# Altium schematic symbol library MCU_ST_STM32H7.SchLib: 191 symbols (part 3 of 8) (continued)
## STM32H725IETx (continued)
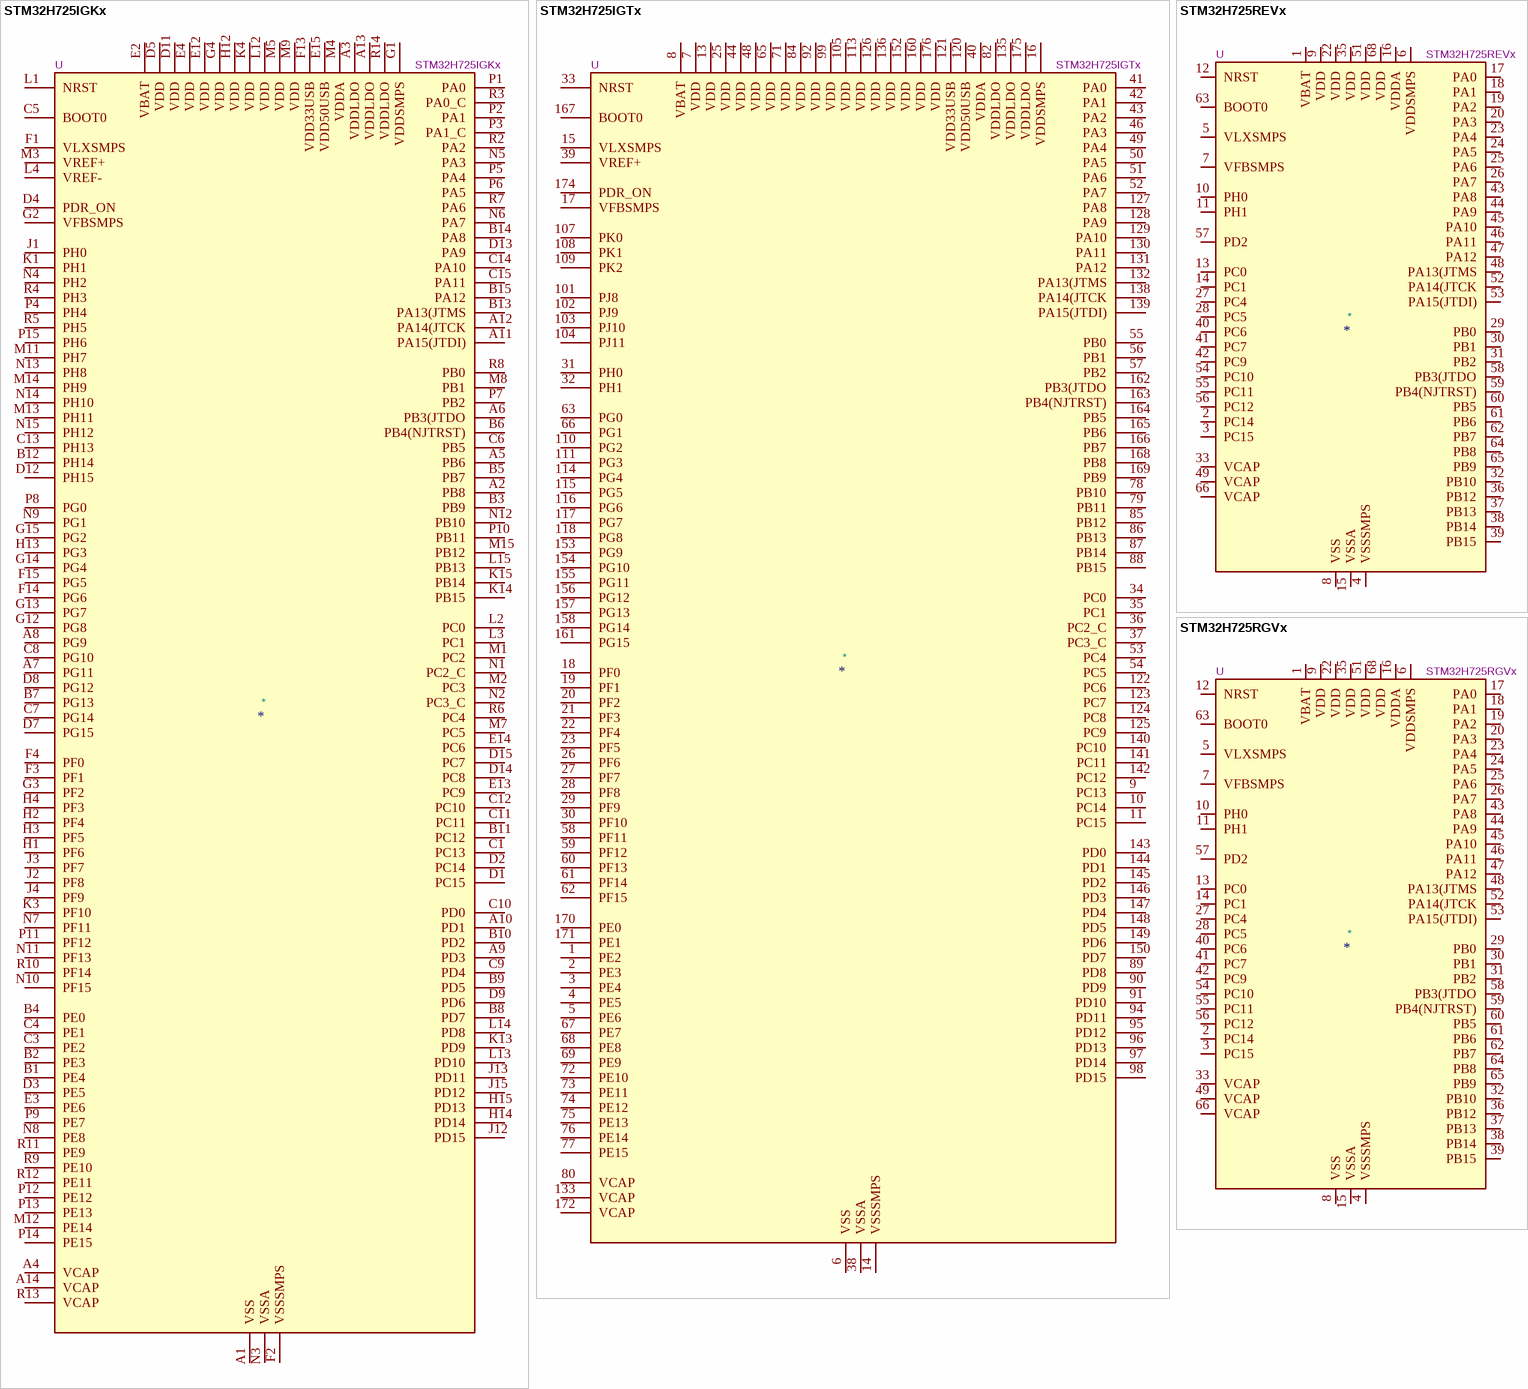
[diagram p24: symbols STM32H725IGKx to STM32H725RGVx]

## STM32H725IGKx
designator *  value STM32H725IGKx  Reference: U
ki_keywords: Arm Cortex-M7 STM32H7 STM32H725/735; ki_description: STMicroelectronics Arm Cortex-M7 MCU, 1024KB flash, 564KB RAM, 550 MHz, 1.62-3.6V, 132 GPIO, UFBGA176; ki_fp_filters: *UFBGA*10x10mm*Layout15x15*P0.65mm*; Footprint: Package_BGA:UFBGA-201_10x10mm_Layout15x15_P0.65mm; Datasheet: https://www.st.com/resource/en/datasheet/stm32h725ig.pdf
pins: A1 VSS, A2 PB8, A3 VDDLDO, A4 VCAP, A5 PB6, A6 PB3(JTDO, A7 PG11, A8 PG9, A9 PD3, A10 PD1, A11 PA15(JTDI), A12 PA14(JTCK, A13 VDDLDO, A14 VCAP, A15 VSS hidden, B1 PE4, B2 PE3, B3 PB9, B4 PE0, B5 PB7, B6 PB4(NJTRST), B7 PG13, B8 PD7, B9 PD5, B10 PD2, B11 PC12, B12 PH14, B13 PA13(JTMS, B14 PA8, B15 PA12, C1 PC13, C2 VSS hidden, C3 PE2, C4 PE1, C5 BOOT0, C6 PB5, C7 PG14, C8 PG10, C9 PD4, C10 PD0, C11 PC11, C12 PC10, C13 PH13, C14 PA10, C15 PA11, D1 PC15, D2 PC14, D3 PE5, D4 PDR_ON, D5 VDD, D6 VSS hidden, D7 PG15, D8 PG12, D9 PD6, D10 VSS hidden, D11 VDD, D12 PH15, D13 PA9, D14 PC8, D15 PC7, E1 VSS hidden, E2 VBAT, E3 PE6, E4 VDD, E12 VDD, E13 PC9, E14 PC6, E15 VDD50USB, F1 VLXSMPS, F2 VSSSMPS, F3 PF1, F4 PF0, F6 VSS hidden, F7 VSS hidden, F8 VSS hidden, F9 VSS hidden, F10 VSS hidden, F12 VSS hidden, F13 VDD33USB, F14 PG6, F15 PG5, G1 VDDSMPS, G2 VFBSMPS, G3 PF2, G4 VDD, G6 VSS hidden, G7 VSS hidden, G8 VSS hidden, G9 VSS hidden, G10 VSS hidden, G12 PG8, G13 PG7, G14 PG4, G15 PG2, H1 PF6, H2 PF4, H3 PF5, H4 PF3, H6 VSS hidden, H7 VSS hidden, H8 VSS hidden, H9 VSS hidden, H10 VSS hidden, H12 VDD, H13 PG3, H14 PD14, H15 PD13, J1 PH0, J2 PF8, J3 PF7, J4 PF9, J6 VSS hidden, J7 VSS hidden, J8 VSS hidden, J9 VSS hidden, J10 VSS hidden, J12 PD15, J13 PD11, J14 VSS hidden, J15 PD12, K1 PH1, K2 VSS hidden, K3 PF10, K4 VDD, K6 VSS hidden, K7 VSS hidden, K8 VSS hidden, K9 VSS hidden, K10 VSS hidden, K12 VSS hidden, K13 PD9, K14 PB15, K15 PB14, L1 NRST, L2 PC0, L3 PC1, L4 VREF-, L12 VDD, L13 PD10, L14 PD8, L15 PB13, M1 PC2, M2 PC3, M3 VREF+, M4 VDDA, M5 VDD, M6 VSS hidden, M7 PC5, M8 PB1, M9 VDD, M10 VSS hidden, M11 PH7, M12 PE14, M13 PH11, M14 PH9, M15 PB12, N1 PC2_C, N2 PC3_C, N3 VSSA, N4 PH2, N5 PA3, N6 PA7, N7 PF11, N8 PE8, N9 PG1, N10 PF15, N11 PF13, N12 PB10, N13 PH8, N14 PH10, N15 PH12, P1 PA0, P2 PA1, P3 PA1_C, P4 PH4, P5 PA4, P6 PA5, P7 PB2, P8 PG0, P9 PE7, P10 PB11, P11 PF12, P12 PE12, P13 PE13, P14 PE15, P15 PH6, R1 VSS hidden, R2 PA2, R3 PA0_C, R4 PH3, R5 PH5, R6 PC4, R7 PA6, R8 PB0, R9 PE10, R10 PF14, R11 PE9, R12 PE11, R13 VCAP, R14 VDDLDO, R15 VSS hidden

## STM32H725IGTx
designator *  value STM32H725IGTx  Reference: U
ki_keywords: Arm Cortex-M7 STM32H7 STM32H725/735; ki_description: STMicroelectronics Arm Cortex-M7 MCU, 1024KB flash, 564KB RAM, 550 MHz, 1.62-3.6V, 121 GPIO, LQFP176; ki_fp_filters: LQFP*24x24mm*P0.5mm*; Footprint: Package_QFP:LQFP-176_24x24mm_P0.5mm; Datasheet: https://www.st.com/resource/en/datasheet/stm32h725ig.pdf
pins: 1 PE2, 2 PE3, 3 PE4, 4 PE5, 5 PE6, 6 VSS, 7 VDD, 8 VBAT, 9 PC13, 10 PC14, 11 PC15, 12 VSS hidden, 13 VDD, 14 VSSSMPS, 15 VLXSMPS, 16 VDDSMPS, 17 VFBSMPS, 18 PF0, 19 PF1, 20 PF2, 21 PF3, 22 PF4, 23 PF5, 24 VSS hidden, 25 VDD, 26 PF6, 27 PF7, 28 PF8, 29 PF9, 30 PF10, 31 PH0, 32 PH1, 33 NRST, 34 PC0, 35 PC1, 36 PC2_C, 37 PC3_C, 38 VSSA, 39 VREF+, 40 VDDA, 41 PA0, 42 PA1, 43 PA2, 44 VDD, 45 VSS hidden, 46 PA3, 47 VSS hidden, 48 VDD, 49 PA4, 50 PA5, 51 PA6, 52 PA7, 53 PC4, 54 PC5, 55 PB0, 56 PB1, 57 PB2, 58 PF11, 59 PF12, 60 PF13, 61 PF14, 62 PF15, 63 PG0, 64 VSS hidden, 65 VDD, 66 PG1, 67 PE7, 68 PE8, 69 PE9, 70 VSS hidden, 71 VDD, 72 PE10, 73 PE11, 74 PE12, 75 PE13, 76 PE14, 77 PE15, 78 PB10, 79 PB11, 80 VCAP, 81 VSS hidden, 82 VDDLDO, 83 VSS hidden, 84 VDD, 85 PB12, 86 PB13, 87 PB14, 88 PB15, 89 PD8, 90 PD9, 91 PD10, 92 VDD, 93 VSS hidden, 94 PD11, 95 PD12, 96 PD13, 97 PD14, 98 PD15, 99 VDD, 100 VSS hidden, 101 PJ8, 102 PJ9, 103 PJ10, 104 PJ11, 105 VDD, 106 VSS hidden, 107 PK0, 108 PK1, 109 PK2, 110 PG2, 111 PG3, 112 VSS hidden, 113 VDD, 114 PG4, 115 PG5, 116 PG6, 117 PG7, 118 PG8, 119 VSS hidden, 120 VDD50USB, 121 VDD33USB, 122 PC6, 123 PC7, 124 PC8, 125 PC9, 126 VDD, 127 PA8, 128 PA9, 129 PA10, 130 PA11, 131 PA12, 132 PA13(JTMS, 133 VCAP, 134 VSS hidden, 135 VDDLDO, 136 VDD, 137 VSS hidden, 138 PA14(JTCK, 139 PA15(JTDI), 140 PC10, 141 PC11, 142 PC12, 143 PD0, 144 PD1, 145 PD2, 146 PD3, 147 PD4, 148 PD5, 149 PD6, 150 PD7, 151 VSS hidden, 152 VDD, 153 PG9, 154 PG10, 155 PG11, 156 PG12, 157 PG13, 158 PG14, 159 VSS hidden, 160 VDD, 161 PG15, 162 PB3(JTDO, 163 PB4(NJTRST), 164 PB5, 165 PB6, 166 PB7, 167 BOOT0, 168 PB8, 169 PB9, 170 PE0, 171 PE1, 172 VCAP, 173 VSS hidden, 174 PDR_ON, 175 VDDLDO, 176 VDD

## STM32H725REVx
designator *  value STM32H725REVx  Reference: U
ki_keywords: Arm Cortex-M7 STM32H7 STM32H725/735; ki_description: STMicroelectronics Arm Cortex-M7 MCU, 512KB flash, 564KB RAM, 550 MHz, 1.71-3.6V, 46 GPIO, VFQFPN68; ki_fp_filters: QFN*1EP*8x8mm*P0.4mm*; Footprint: Package_DFN_QFN:QFN-68-1EP_8x8mm_P0.4mm_EP6.4x6.4mm; Datasheet: https://www.st.com/resource/en/datasheet/stm32h725re.pdf
pins: 1 VBAT, 2 PC14, 3 PC15, 4 VSSSMPS, 5 VLXSMPS, 6 VDDSMPS, 7 VFBSMPS, 8 VSS, 9 VDD, 10 PH0, 11 PH1, 12 NRST, 13 PC0, 14 PC1, 15 VSSA, 16 VDDA, 17 PA0, 18 PA1, 19 PA2, 20 PA3, 21 VSS hidden, 22 VDD, 23 PA4, 24 PA5, 25 PA6, 26 PA7, 27 PC4, 28 PC5, 29 PB0, 30 PB1, 31 PB2, 32 PB10, 33 VCAP, 34 VSS hidden, 35 VDD, 36 PB12, 37 PB13, 38 PB14, 39 PB15, 40 PC6, 41 PC7, 42 PC9, 43 PA8, 44 PA9, 45 PA10, 46 PA11, 47 PA12, 48 PA13(JTMS, 49 VCAP, 50 VSS hidden, 51 VDD, 52 PA14(JTCK, 53 PA15(JTDI), 54 PC10, 55 PC11, 56 PC12, 57 PD2, 58 PB3(JTDO, 59 PB4(NJTRST), 60 PB5, 61 PB6, 62 PB7, 63 BOOT0, 64 PB8, 65 PB9, 66 VCAP, 67 VSS hidden, 68 VDD, 69 VSS hidden

## STM32H725RGVx
designator *  value STM32H725RGVx  Reference: U
ki_keywords: Arm Cortex-M7 STM32H7 STM32H725/735; ki_description: STMicroelectronics Arm Cortex-M7 MCU, 1024KB flash, 564KB RAM, 550 MHz, 1.71-3.6V, 46 GPIO, VFQFPN68; ki_fp_filters: QFN*1EP*8x8mm*P0.4mm*; Footprint: Package_DFN_QFN:QFN-68-1EP_8x8mm_P0.4mm_EP6.4x6.4mm; Datasheet: https://www.st.com/resource/en/datasheet/stm32h725rg.pdf
pins: 1 VBAT, 2 PC14, 3 PC15, 4 VSSSMPS, 5 VLXSMPS, 6 VDDSMPS, 7 VFBSMPS, 8 VSS, 9 VDD, 10 PH0, 11 PH1, 12 NRST, 13 PC0, 14 PC1, 15 VSSA, 16 VDDA, 17 PA0, 18 PA1, 19 PA2, 20 PA3, 21 VSS hidden, 22 VDD, 23 PA4, 24 PA5, 25 PA6, 26 PA7, 27 PC4, 28 PC5, 29 PB0, 30 PB1, 31 PB2, 32 PB10, 33 VCAP, 34 VSS hidden, 35 VDD, 36 PB12, 37 PB13, 38 PB14, 39 PB15, 40 PC6, 41 PC7, 42 PC9, 43 PA8, 44 PA9, 45 PA10, 46 PA11, 47 PA12, 48 PA13(JTMS, 49 VCAP, 50 VSS hidden, 51 VDD, 52 PA14(JTCK, 53 PA15(JTDI), 54 PC10, 55 PC11, 56 PC12, 57 PD2, 58 PB3(JTDO, 59 PB4(NJTRST), 60 PB5, 61 PB6, 62 PB7, 63 BOOT0, 64 PB8, 65 PB9, 66 VCAP, 67 VSS hidden, 68 VDD, 69 VSS hidden

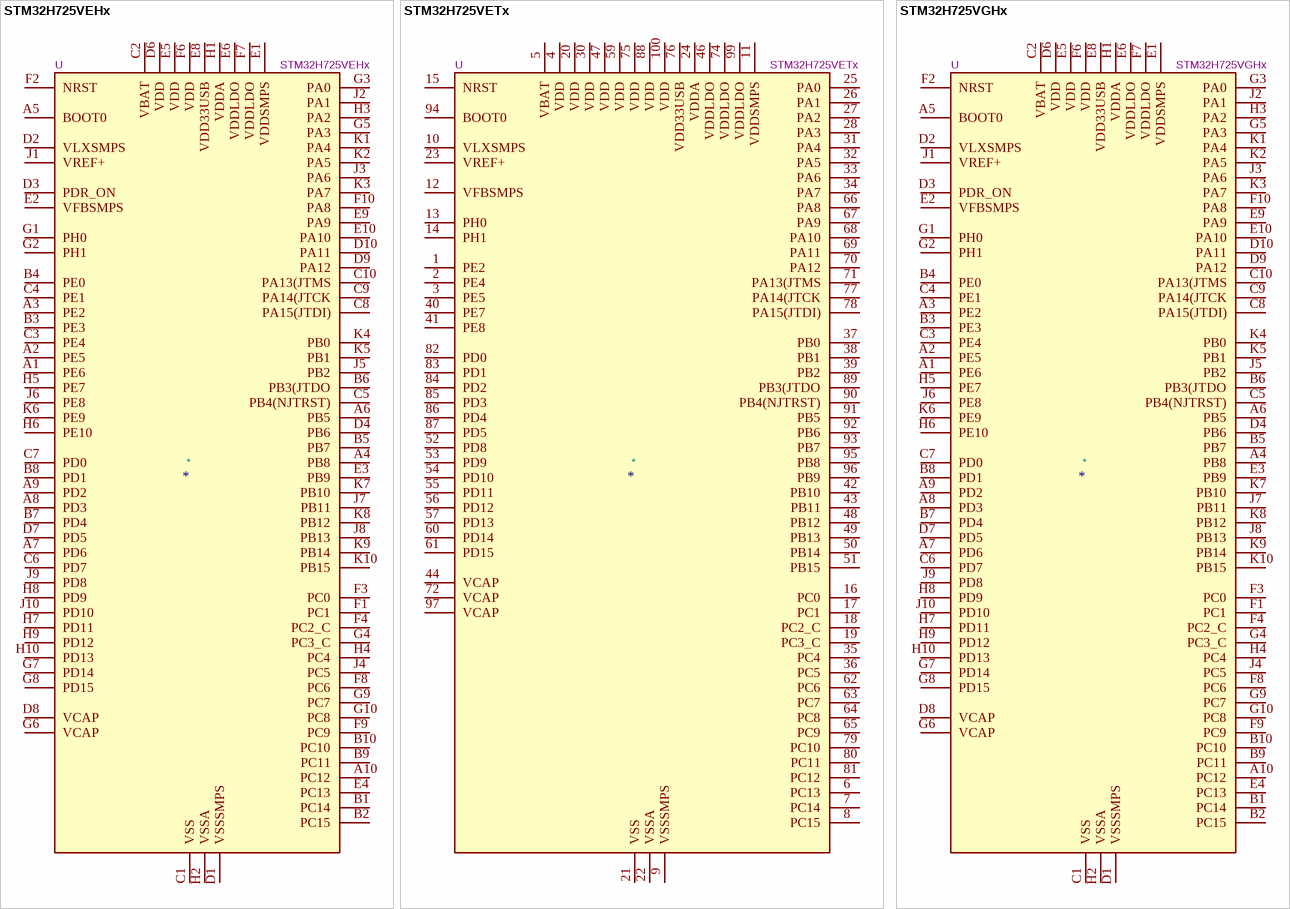
[diagram p25: symbols STM32H725VEHx to STM32H725VGHx]

## STM32H725VEHx
designator *  value STM32H725VEHx  Reference: U
ki_keywords: Arm Cortex-M7 STM32H7 STM32H725/735; ki_description: STMicroelectronics Arm Cortex-M7 MCU, 512KB flash, 564KB RAM, 550 MHz, 1.62-3.6V, 77 GPIO, TFBGA100; ki_fp_filters: TFBGA*8x8mm*Layout10x10*P0.8mm*; Footprint: Package_BGA:TFBGA-100_8x8mm_Layout10x10_P0.8mm; Datasheet: https://www.st.com/resource/en/datasheet/stm32h725ve.pdf
pins: A1 PE6, A2 PE5, A3 PE2, A4 PB8, A5 BOOT0, A6 PB5, A7 PD6, A8 PD3, A9 PD2, A10 PC12, B1 PC14, B2 PC15, B3 PE3, B4 PE0, B5 PB7, B6 PB3(JTDO, B7 PD4, B8 PD1, B9 PC11, B10 PC10, C1 VSS, C2 VBAT, C3 PE4, C4 PE1, C5 PB4(NJTRST), C6 PD7, C7 PD0, C8 PA15(JTDI), C9 PA14(JTCK, C10 PA13(JTMS, D1 VSSSMPS, D2 VLXSMPS, D3 PDR_ON, D4 PB6, D5 VSS hidden, D6 VDD, D7 PD5, D8 VCAP, D9 PA12, D10 PA11, E1 VDDSMPS, E2 VFBSMPS, E3 PB9, E4 PC13, E5 VDD, E6 VDDLDO, E7 VSS hidden, E8 VDD33USB, E9 PA9, E10 PA10, F1 PC1, F2 NRST, F3 PC0, F4 PC2_C, F5 VSS hidden, F6 VDD, F7 VDDLDO, F8 PC6, F9 PC9, F10 PA8, G1 PH0, G2 PH1, G3 PA0, G4 PC3_C, G5 PA3, G6 VCAP, G7 PD14, G8 PD15, G9 PC7, G10 PC8, H1 VDDA, H2 VSSA, H3 PA2, H4 PC4, H5 PE7, H6 PE10, H7 PD11, H8 PD9, H9 PD12, H10 PD13, J1 VREF+, J2 PA1, J3 PA6, J4 PC5, J5 PB2, J6 PE8, J7 PB11, J8 PB13, J9 PD8, J10 PD10, K1 PA4, K2 PA5, K3 PA7, K4 PB0, K5 PB1, K6 PE9, K7 PB10, K8 PB12, K9 PB14, K10 PB15

## STM32H725VETx
designator *  value STM32H725VETx  Reference: U
ki_keywords: Arm Cortex-M7 STM32H7 STM32H725/735; ki_description: STMicroelectronics Arm Cortex-M7 MCU, 512KB flash, 564KB RAM, 550 MHz, 1.71-3.6V, 69 GPIO, LQFP100; ki_fp_filters: LQFP*14x14mm*P0.5mm*; Footprint: Package_QFP:LQFP-100_14x14mm_P0.5mm; Datasheet: https://www.st.com/resource/en/datasheet/stm32h725ve.pdf
pins: 1 PE2, 2 PE4, 3 PE5, 4 VDD, 5 VBAT, 6 PC13, 7 PC14, 8 PC15, 9 VSSSMPS, 10 VLXSMPS, 11 VDDSMPS, 12 VFBSMPS, 13 PH0, 14 PH1, 15 NRST, 16 PC0, 17 PC1, 18 PC2_C, 19 PC3_C, 20 VDD, 21 VSS, 22 VSSA, 23 VREF+, 24 VDDA, 25 PA0, 26 PA1, 27 PA2, 28 PA3, 29 VSS hidden, 30 VDD, 31 PA4, 32 PA5, 33 PA6, 34 PA7, 35 PC4, 36 PC5, 37 PB0, 38 PB1, 39 PB2, 40 PE7, 41 PE8, 42 PB10, 43 PB11, 44 VCAP, 45 VSS hidden, 46 VDDLDO, 47 VDD, 48 PB12, 49 PB13, 50 PB14, 51 PB15, 52 PD8, 53 PD9, 54 PD10, 55 PD11, 56 PD12, 57 PD13, 58 VSS hidden, 59 VDD, 60 PD14, 61 PD15, 62 PC6, 63 PC7, 64 PC8, 65 PC9, 66 PA8, 67 PA9, 68 PA10, 69 PA11, 70 PA12, 71 PA13(JTMS, 72 VCAP, 73 VSS hidden, 74 VDDLDO, 75 VDD, 76 VDD33USB, 77 PA14(JTCK, 78 PA15(JTDI), 79 PC10, 80 PC11, 81 PC12, 82 PD0, 83 PD1, 84 PD2, 85 PD3, 86 PD4, 87 PD5, 88 VDD, 89 PB3(JTDO, 90 PB4(NJTRST), 91 PB5, 92 PB6, 93 PB7, 94 BOOT0, 95 PB8, 96 PB9, 97 VCAP, 98 VSS hidden, 99 VDDLDO, 100 VDD

## STM32H725VGHx
designator *  value STM32H725VGHx  Reference: U
ki_keywords: Arm Cortex-M7 STM32H7 STM32H725/735; ki_description: STMicroelectronics Arm Cortex-M7 MCU, 1024KB flash, 564KB RAM, 550 MHz, 1.62-3.6V, 77 GPIO, TFBGA100; ki_fp_filters: TFBGA*8x8mm*Layout10x10*P0.8mm*; Footprint: Package_BGA:TFBGA-100_8x8mm_Layout10x10_P0.8mm; Datasheet: https://www.st.com/resource/en/datasheet/stm32h725vg.pdf
pins: A1 PE6, A2 PE5, A3 PE2, A4 PB8, A5 BOOT0, A6 PB5, A7 PD6, A8 PD3, A9 PD2, A10 PC12, B1 PC14, B2 PC15, B3 PE3, B4 PE0, B5 PB7, B6 PB3(JTDO, B7 PD4, B8 PD1, B9 PC11, B10 PC10, C1 VSS, C2 VBAT, C3 PE4, C4 PE1, C5 PB4(NJTRST), C6 PD7, C7 PD0, C8 PA15(JTDI), C9 PA14(JTCK, C10 PA13(JTMS, D1 VSSSMPS, D2 VLXSMPS, D3 PDR_ON, D4 PB6, D5 VSS hidden, D6 VDD, D7 PD5, D8 VCAP, D9 PA12, D10 PA11, E1 VDDSMPS, E2 VFBSMPS, E3 PB9, E4 PC13, E5 VDD, E6 VDDLDO, E7 VSS hidden, E8 VDD33USB, E9 PA9, E10 PA10, F1 PC1, F2 NRST, F3 PC0, F4 PC2_C, F5 VSS hidden, F6 VDD, F7 VDDLDO, F8 PC6, F9 PC9, F10 PA8, G1 PH0, G2 PH1, G3 PA0, G4 PC3_C, G5 PA3, G6 VCAP, G7 PD14, G8 PD15, G9 PC7, G10 PC8, H1 VDDA, H2 VSSA, H3 PA2, H4 PC4, H5 PE7, H6 PE10, H7 PD11, H8 PD9, H9 PD12, H10 PD13, J1 VREF+, J2 PA1, J3 PA6, J4 PC5, J5 PB2, J6 PE8, J7 PB11, J8 PB13, J9 PD8, J10 PD10, K1 PA4, K2 PA5, K3 PA7, K4 PB0, K5 PB1, K6 PE9, K7 PB10, K8 PB12, K9 PB14, K10 PB15

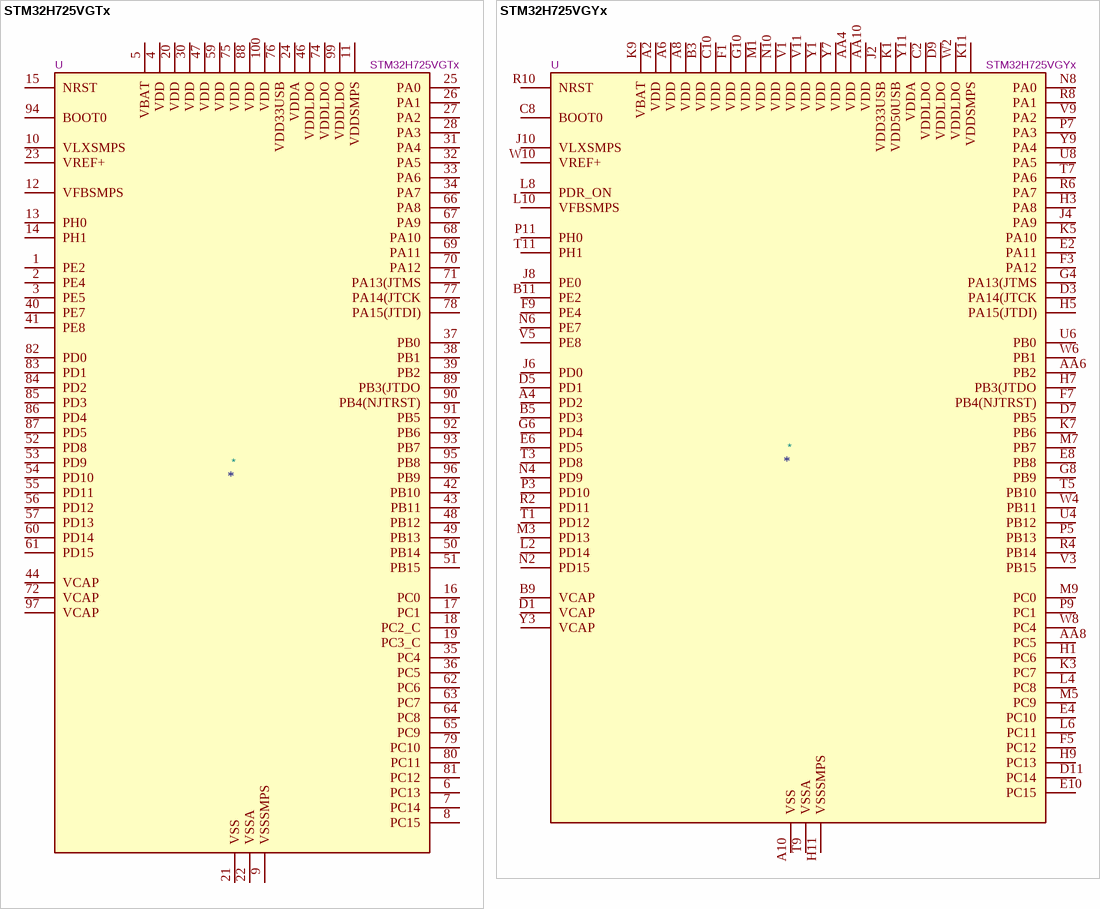
[diagram p26: symbols STM32H725VGTx to STM32H725VGYx]

## STM32H725VGTx
designator *  value STM32H725VGTx  Reference: U
ki_keywords: Arm Cortex-M7 STM32H7 STM32H725/735; ki_description: STMicroelectronics Arm Cortex-M7 MCU, 1024KB flash, 564KB RAM, 550 MHz, 1.71-3.6V, 69 GPIO, LQFP100; ki_fp_filters: LQFP*14x14mm*P0.5mm*; Footprint: Package_QFP:LQFP-100_14x14mm_P0.5mm; Datasheet: https://www.st.com/resource/en/datasheet/stm32h725vg.pdf
pins: 1 PE2, 2 PE4, 3 PE5, 4 VDD, 5 VBAT, 6 PC13, 7 PC14, 8 PC15, 9 VSSSMPS, 10 VLXSMPS, 11 VDDSMPS, 12 VFBSMPS, 13 PH0, 14 PH1, 15 NRST, 16 PC0, 17 PC1, 18 PC2_C, 19 PC3_C, 20 VDD, 21 VSS, 22 VSSA, 23 VREF+, 24 VDDA, 25 PA0, 26 PA1, 27 PA2, 28 PA3, 29 VSS hidden, 30 VDD, 31 PA4, 32 PA5, 33 PA6, 34 PA7, 35 PC4, 36 PC5, 37 PB0, 38 PB1, 39 PB2, 40 PE7, 41 PE8, 42 PB10, 43 PB11, 44 VCAP, 45 VSS hidden, 46 VDDLDO, 47 VDD, 48 PB12, 49 PB13, 50 PB14, 51 PB15, 52 PD8, 53 PD9, 54 PD10, 55 PD11, 56 PD12, 57 PD13, 58 VSS hidden, 59 VDD, 60 PD14, 61 PD15, 62 PC6, 63 PC7, 64 PC8, 65 PC9, 66 PA8, 67 PA9, 68 PA10, 69 PA11, 70 PA12, 71 PA13(JTMS, 72 VCAP, 73 VSS hidden, 74 VDDLDO, 75 VDD, 76 VDD33USB, 77 PA14(JTCK, 78 PA15(JTDI), 79 PC10, 80 PC11, 81 PC12, 82 PD0, 83 PD1, 84 PD2, 85 PD3, 86 PD4, 87 PD5, 88 VDD, 89 PB3(JTDO, 90 PB4(NJTRST), 91 PB5, 92 PB6, 93 PB7, 94 BOOT0, 95 PB8, 96 PB9, 97 VCAP, 98 VSS hidden, 99 VDDLDO, 100 VDD

## STM32H725VGYx
designator *  value STM32H725VGYx  Reference: U
ki_keywords: Arm Cortex-M7 STM32H7 STM32H725/735; ki_description: STMicroelectronics Arm Cortex-M7 MCU, 1024KB flash, 564KB RAM, 550 MHz, 1.62-3.6V, 67 GPIO, WLCSP115; Footprint: Package_CSP:ST_WLCSP-115_3.73x4.15mm_P0.35mm_Stagger; Datasheet: https://www.st.com/resource/en/datasheet/stm32h725vg.pdf; ki_fp_filters: *
pins: A2 VDD, A4 PD2, A6 VDD, A8 VDD, A10 VSS, AA2 VSS hidden, AA4 VDD, AA6 PB2, AA8 PC5, AA10 VDD, B1 VSS hidden, B3 VDD, B5 PD3, B7 VSS hidden, B9 VCAP, B11 PE2, C2 VDDLDO, C4 VSS hidden, C6 VSS hidden, C8 BOOT0, C10 VDD, D1 VCAP, D3 PA14(JTCK, D5 PD1, D7 PB5, D9 VDDLDO, D11 PC14, E2 PA11, E4 PC10, E6 PD5, E8 PB8, E10 PC15, F1 VDD, F3 PA12, F5 PC12, F7 PB4(NJTRST), F9 PE4, F11 VSS hidden, G2 VSS hidden, G4 PA13(JTMS, G6 PD4, G8 PB9, G10 VDD, H1 PC6, H3 PA8, H5 PA15(JTDI), H7 PB3(JTDO, H9 PC13, H11 VSSSMPS, J2 VDD33USB, J4 PA9, J6 PD0, J8 PE0, J10 VLXSMPS, K1 VDD50USB, K3 PC7, K5 PA10, K7 PB6, K9 VBAT, K11 VDDSMPS, L2 PD14, L4 PC8, L6 PC11, L8 PDR_ON, L10 VFBSMPS, M1 VDD, M3 PD13, M5 PC9, M7 PB7, M9 PC0, M11 VSS hidden, N2 PD15, N4 PD9, N6 PE7, N8 PA0, N10 VDD, P1 VSS hidden, P3 PD10, P5 PB13, P7 PA3, P9 PC1, P11 PH0, R2 PD11, R4 PB14, R6 PA7, R8 PA1, R10 NRST, T1 PD12, T3 PD8, T5 PB10, T7 PA6, T9 VSSA, T11 PH1, U2 VSS hidden, U4 PB12, U6 PB0, U8 PA5, U10 VSS hidden, V1 VDD, V3 PB15, V5 PE8, V7 VSS hidden, V9 PA2, V11 VDD, W2 VDDLDO, W4 PB11, W6 PB1, W8 PC4, W10 VREF+, Y1 VDD, Y3 VCAP, Y5 VSS hidden, Y7 VDD, Y9 PA4, Y11 VDDA

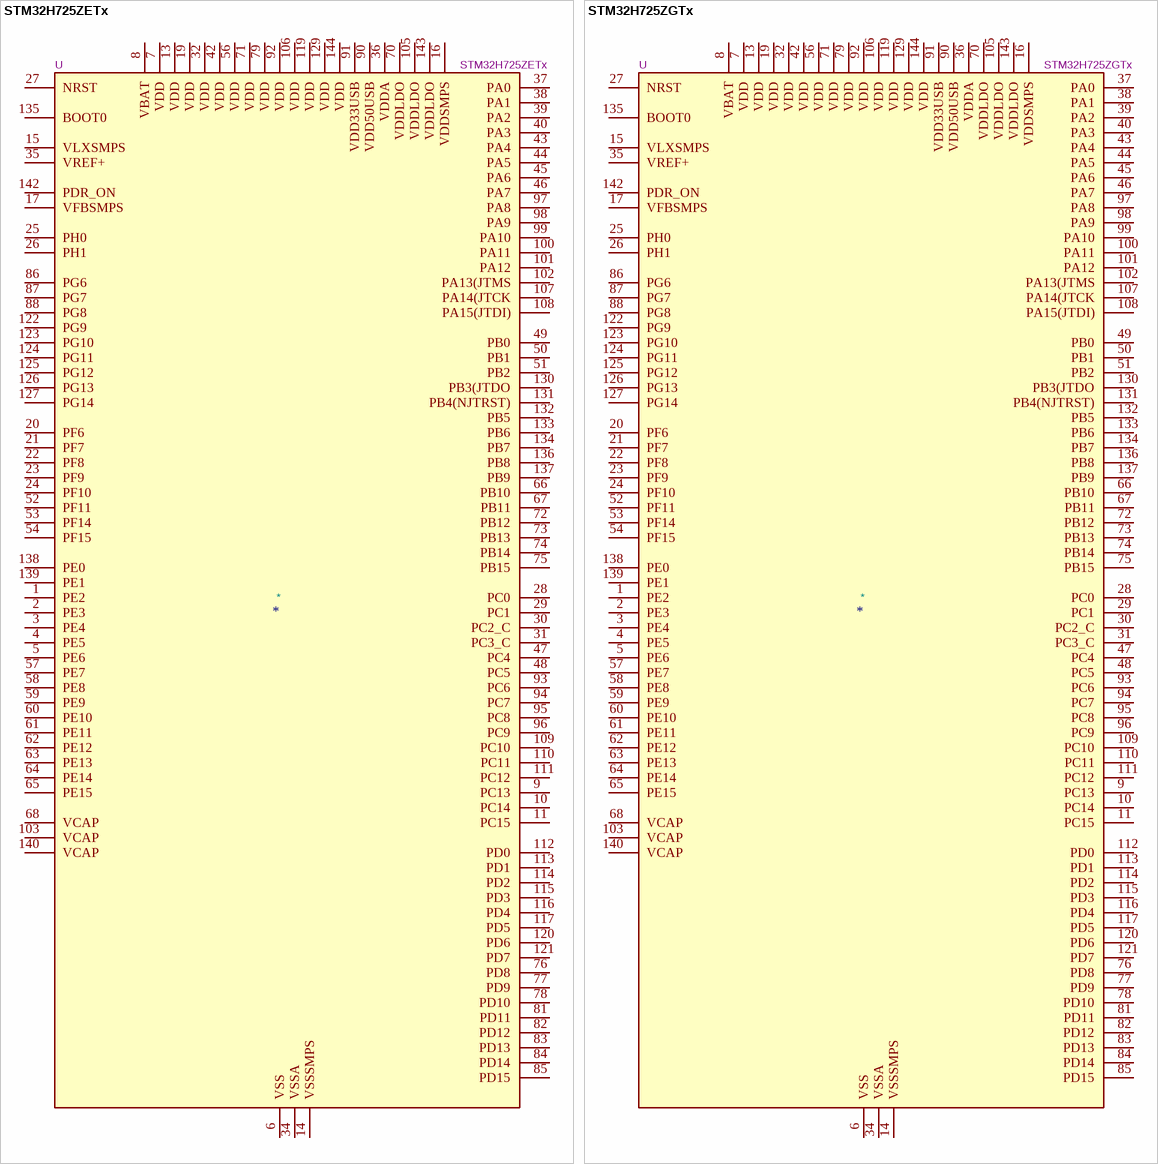
[diagram p27: symbols STM32H725ZETx to STM32H725ZGTx]

## STM32H725ZETx
designator *  value STM32H725ZETx  Reference: U
ki_keywords: Arm Cortex-M7 STM32H7 STM32H725/735; ki_description: STMicroelectronics Arm Cortex-M7 MCU, 512KB flash, 564KB RAM, 550 MHz, 1.62-3.6V, 99 GPIO, LQFP144; ki_fp_filters: LQFP*20x20mm*P0.5mm*; Footprint: Package_QFP:LQFP-144_20x20mm_P0.5mm; Datasheet: https://www.st.com/resource/en/datasheet/stm32h725ze.pdf
pins: 1 PE2, 2 PE3, 3 PE4, 4 PE5, 5 PE6, 6 VSS, 7 VDD, 8 VBAT, 9 PC13, 10 PC14, 11 PC15, 12 VSS hidden, 13 VDD, 14 VSSSMPS, 15 VLXSMPS, 16 VDDSMPS, 17 VFBSMPS, 18 VSS hidden, 19 VDD, 20 PF6, 21 PF7, 22 PF8, 23 PF9, 24 PF10, 25 PH0, 26 PH1, 27 NRST, 28 PC0, 29 PC1, 30 PC2_C, 31 PC3_C, 32 VDD, 33 VSS hidden, 34 VSSA, 35 VREF+, 36 VDDA, 37 PA0, 38 PA1, 39 PA2, 40 PA3, 41 VSS hidden, 42 VDD, 43 PA4, 44 PA5, 45 PA6, 46 PA7, 47 PC4, 48 PC5, 49 PB0, 50 PB1, 51 PB2, 52 PF11, 53 PF14, 54 PF15, 55 VSS hidden, 56 VDD, 57 PE7, 58 PE8, 59 PE9, 60 PE10, 61 PE11, 62 PE12, 63 PE13, 64 PE14, 65 PE15, 66 PB10, 67 PB11, 68 VCAP, 69 VSS hidden, 70 VDDLDO, 71 VDD, 72 PB12, 73 PB13, 74 PB14, 75 PB15, 76 PD8, 77 PD9, 78 PD10, 79 VDD, 80 VSS hidden, 81 PD11, 82 PD12, 83 PD13, 84 PD14, 85 PD15, 86 PG6, 87 PG7, 88 PG8, 89 VSS hidden, 90 VDD50USB, 91 VDD33USB, 92 VDD, 93 PC6, 94 PC7, 95 PC8, 96 PC9, 97 PA8, 98 PA9, 99 PA10, 100 PA11, 101 PA12, 102 PA13(JTMS, 103 VCAP, 104 VSS hidden, 105 VDDLDO, 106 VDD, 107 PA14(JTCK, 108 PA15(JTDI), 109 PC10, 110 PC11, 111 PC12, 112 PD0, 113 PD1, 114 PD2, 115 PD3, 116 PD4, 117 PD5, 118 VSS hidden, 119 VDD, 120 PD6, 121 PD7, 122 PG9, 123 PG10, 124 PG11, 125 PG12, 126 PG13, 127 PG14, 128 VSS hidden, 129 VDD, 130 PB3(JTDO, 131 PB4(NJTRST), 132 PB5, 133 PB6, 134 PB7, 135 BOOT0, 136 PB8, 137 PB9, 138 PE0, 139 PE1, 140 VCAP, 141 VSS hidden, 142 PDR_ON, 143 VDDLDO, 144 VDD

## STM32H725ZGTx
designator *  value STM32H725ZGTx  Reference: U
ki_keywords: Arm Cortex-M7 STM32H7 STM32H725/735; ki_description: STMicroelectronics Arm Cortex-M7 MCU, 1024KB flash, 564KB RAM, 550 MHz, 1.62-3.6V, 99 GPIO, LQFP144; ki_fp_filters: LQFP*20x20mm*P0.5mm*; Footprint: Package_QFP:LQFP-144_20x20mm_P0.5mm; Datasheet: https://www.st.com/resource/en/datasheet/stm32h725zg.pdf
pins: 1 PE2, 2 PE3, 3 PE4, 4 PE5, 5 PE6, 6 VSS, 7 VDD, 8 VBAT, 9 PC13, 10 PC14, 11 PC15, 12 VSS hidden, 13 VDD, 14 VSSSMPS, 15 VLXSMPS, 16 VDDSMPS, 17 VFBSMPS, 18 VSS hidden, 19 VDD, 20 PF6, 21 PF7, 22 PF8, 23 PF9, 24 PF10, 25 PH0, 26 PH1, 27 NRST, 28 PC0, 29 PC1, 30 PC2_C, 31 PC3_C, 32 VDD, 33 VSS hidden, 34 VSSA, 35 VREF+, 36 VDDA, 37 PA0, 38 PA1, 39 PA2, 40 PA3, 41 VSS hidden, 42 VDD, 43 PA4, 44 PA5, 45 PA6, 46 PA7, 47 PC4, 48 PC5, 49 PB0, 50 PB1, 51 PB2, 52 PF11, 53 PF14, 54 PF15, 55 VSS hidden, 56 VDD, 57 PE7, 58 PE8, 59 PE9, 60 PE10, 61 PE11, 62 PE12, 63 PE13, 64 PE14, 65 PE15, 66 PB10, 67 PB11, 68 VCAP, 69 VSS hidden, 70 VDDLDO, 71 VDD, 72 PB12, 73 PB13, 74 PB14, 75 PB15, 76 PD8, 77 PD9, 78 PD10, 79 VDD, 80 VSS hidden, 81 PD11, 82 PD12, 83 PD13, 84 PD14, 85 PD15, 86 PG6, 87 PG7, 88 PG8, 89 VSS hidden, 90 VDD50USB, 91 VDD33USB, 92 VDD, 93 PC6, 94 PC7, 95 PC8, 96 PC9, 97 PA8, 98 PA9, 99 PA10, 100 PA11, 101 PA12, 102 PA13(JTMS, 103 VCAP, 104 VSS hidden, 105 VDDLDO, 106 VDD, 107 PA14(JTCK, 108 PA15(JTDI), 109 PC10, 110 PC11, 111 PC12, 112 PD0, 113 PD1, 114 PD2, 115 PD3, 116 PD4, 117 PD5, 118 VSS hidden, 119 VDD, 120 PD6, 121 PD7, 122 PG9, 123 PG10, 124 PG11, 125 PG12, 126 PG13, 127 PG14, 128 VSS hidden, 129 VDD, 130 PB3(JTDO, 131 PB4(NJTRST), 132 PB5, 133 PB6, 134 PB7, 135 BOOT0, 136 PB8, 137 PB9, 138 PE0, 139 PE1, 140 VCAP, 141 VSS hidden, 142 PDR_ON, 143 VDDLDO, 144 VDD

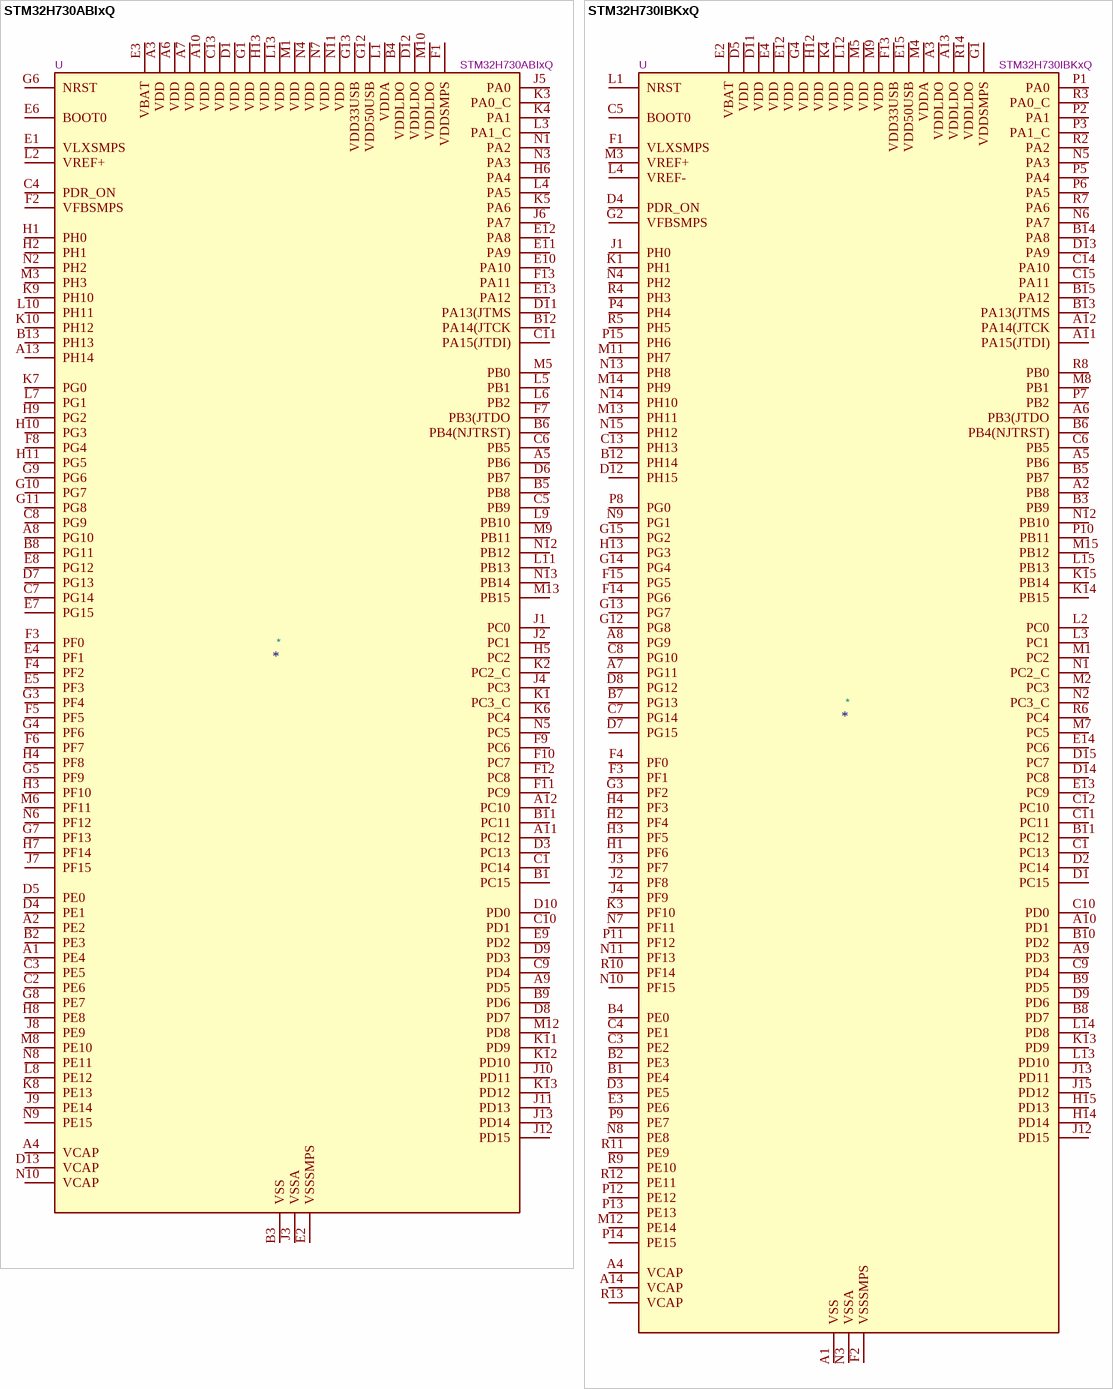
[diagram p28: symbols STM32H730ABIxQ to STM32H730IBKxQ]